# Altium footprint library cool_library.PcbLib: 1182 footprints (part 67 of 75)
Each footprint in its own frame and in the unit in brackets; x right, y up, seen from the top. Pads: shape width x height; smd on the part's side, far side on the other; paste and mask are expansions set on the pad; w line width, h text height; cw(c..) or ccw(c..) is an arc to the next point about the centre after c.
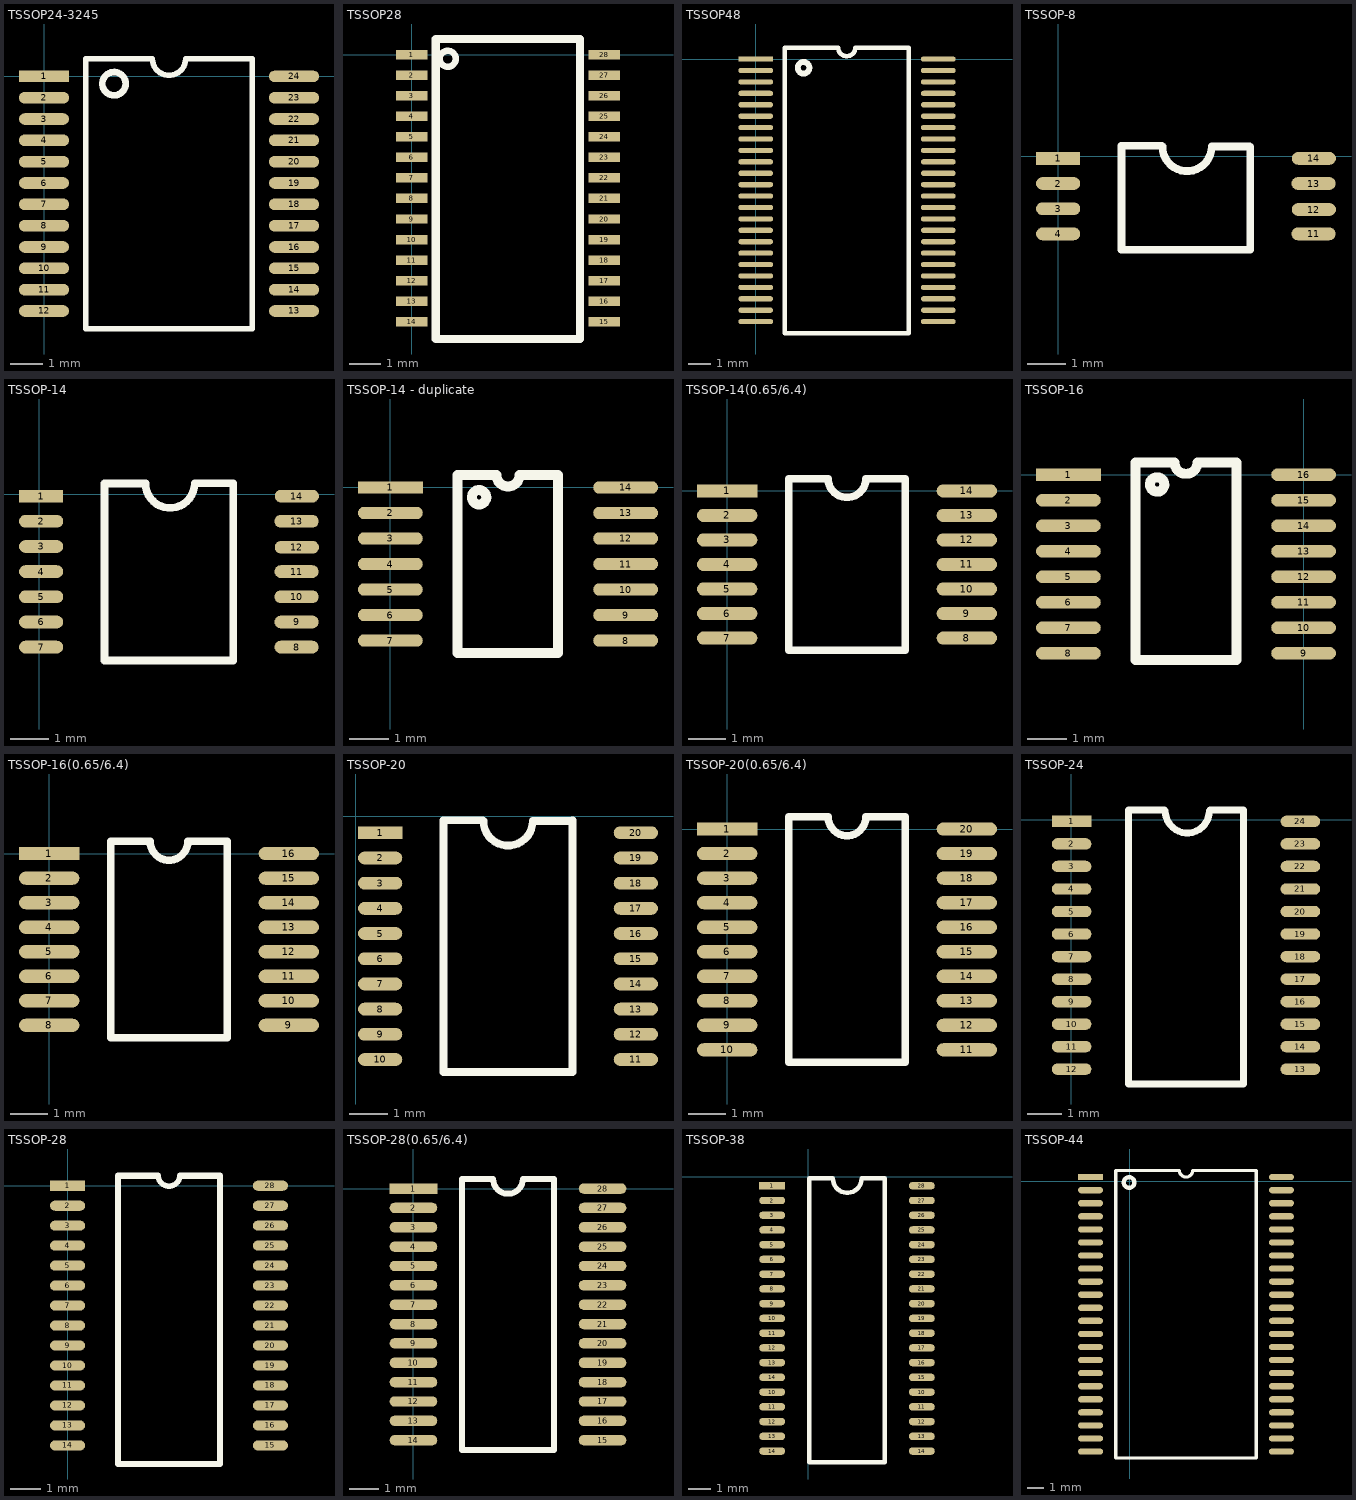
[diagram p66: the footprints below, top view; thin cyan lines are the x and y axes]

## TSSOP24-3245 [mil]
pads (24):
  rect 60x14 smd: 1(0,0)
  oval 60x14 smd: 2(0,-25.59) 3(0,-51.18) 4(0,-76.77) 5(0,-102.36) 6(0,-127.95) 7(0,-153.54) 8(0,-179.13) 9(0,-204.72) 10(0,-230.32) 11(0,-255.91) 12(0,-281.5) 13(300,-281.5) 14(300,-255.91) 15(300,-230.32) 16(300,-204.72) 17(300,-179.13) 18(300,-153.54) 19(300,-127.95) 20(300,-102.36) 21(300,-76.77) 22(300,-51.18) 23(300,-25.59) 24(300,0)
Top Overlay:
  circle w8: c84,-8.75 r14
  lines w6.69: 50,21.25 130,21.25 ccw(c150,21.25) 170,21.25 250,21.25
  lines w7: 50,21.25 50,-302.75 250,-302.75 250,21.25

## TSSOP28 [mm]
pads (28):
  rect 1x0.3 smd: 1(0,0) 2(0,-0.65) 3(0,-1.3) 4(0,-1.95) 5(0,-2.6) 6(0,-3.25) 7(0,-3.9) 8(0,-4.55) 9(0,-5.2) 10(0,-5.85) 11(0,-6.5) 12(0,-7.15) 13(0,-7.8) 14(0,-8.45) 15(6.1,-8.45) 16(6.1,-7.8) 17(6.1,-7.15) 18(6.1,-6.5) 19(6.1,-5.85) 20(6.1,-5.2) 21(6.1,-4.55) 22(6.1,-3.9) 23(6.1,-3.25) 24(6.1,-2.6) 25(6.1,-1.95) 26(6.1,-1.3) 27(6.1,-0.65) 28(6.1,0)
Top Overlay:
  circle w0.203: c1.143,-0.127 r0.254
  lines w0.254: 0.762,-9 5.334,-9 5.334,0.5 0.762,0.5 0.762,-9

## TSSOP48 [mil]
pads (48):
  rect 60x9 smd: 1(0,0)
  oval 60x9 smd: 2(0,-19.68) 3(0,-39.37) 4(0,-59.05) 5(0,-78.74) 6(0,-98.42) 7(0,-118.11) 8(0,-137.79) 9(0,-157.48) 10(0,-177.16) 11(0,-196.85) 12(0,-216.53) 13(0,-236.22) 14(0,-255.91) 15(0,-275.59) 16(0,-295.27) 17(0,-314.96) 18(0,-334.64) 19(0,-354.33) 20(0,-374.01) 21(0,-393.7) 22(0,-413.38) 23(0,-433.07) 24(0,-452.75) 25(315,-452.75) 26(315,-433.07) 27(315,-413.38) 28(315,-393.7) 29(315,-374.01) 30(315,-354.33) 31(315,-334.64) 32(315,-314.96) 33(315,-295.27) 34(315,-275.59) 35(315,-255.91) 36(315,-236.22) 37(315,-216.53) 38(315,-196.85) 39(315,-177.16) 40(315,-157.48) 41(315,-137.79) 42(315,-118.11) 43(315,-98.42) 44(315,-78.74) 45(315,-59.05) 46(315,-39.37) 47(315,-19.68) 48(315,0)
Top Overlay:
  circle w10: c82.6,-15 r10
  lines w7.87: 50,-472.6 264.09,-472.6 264.09,19.84 171.9,19.84 cw(c157.05,19.84) 142.19,19.84 50,19.84 50,-472.6

## TSSOP-8 [mil]
pads (8):
  rect 45x12.99 smd: 1(-0.16,-2)
  oval 45x12.99 smd: 2(-0.16,-27.59) 3(-0.16,-53.18) 4(-0.16,-78.77) 11(259.69,-78.77) 12(260,-54) 13(259.69,-27.59) 14(260,-2)
Top Overlay:
  lines w7.87: 105.2,10.79 64.21,10.79 64.21,-94.88 195.31,-94.88 195.31,9.84 ; 106,10 ccw(c131,10) 156,10 194.52,10

## TSSOP-14 [mil]
pads (14):
  rect 45x12.99 smd: 1(1.84,-2)
  oval 45x12.99 smd: 2(1.84,-27.59) 3(1.84,-53.18) 4(1.84,-78.77) 5(1.84,-104.36) 6(1.84,-129.95) 7(1.84,-155.54) 8(261.69,-155.54) 9(261.69,-129.95) 10(261.69,-104.36) 11(261.69,-78.77) 12(262,-54) 13(261.69,-27.59) 14(262,-2)
Top Overlay:
  lines w7.87: 107.64,10.79 66.21,10.79 66.21,-169.29 197.31,-169.29 197.31,10.79 ; 108,11 ccw(c133,11) 158,11 197.11,11

## TSSOP-14 - duplicate [mil]
pads (14):
  rect 65x12.5 smd: 1(0,0)
  oval 65x12.5 smd: 2(0,-25.59) 3(0,-51.18) 4(0,-76.77) 5(0,-102.36) 6(0,-127.95) 7(0,-153.54) 8(236,-153.54) 9(236,-127.95) 10(236,-102.36) 11(236,-76.77) 12(236,-51.18) 13(236,-25.59) 14(236,0)
Top Overlay:
  lines w10: 89,-17 cw(c89,-9.79) 90.02,-16.93 ; 67.5,-166 67.5,12.5 106.46,12.5 ccw(c118,12.5) 129.54,12.5 168,12.5 168,-166 67.5,-166

## TSSOP-14(0.65/6.4) [mm]
pads (14):
  rect 1.6x0.35 smd: 1(0,0)
  oval 1.6x0.35 smd: 2(0,-0.65) 3(0,-1.3) 4(0,-1.95) 5(0,-2.6) 6(0,-3.25) 7(0,-3.9) 8(6.35,-3.9) 9(6.35,-3.25) 10(6.35,-2.6) 11(6.35,-1.95) 12(6.35,-1.3) 13(6.35,-0.65) 14(6.35,0)
Top Overlay:
  lines w0.2: 1.635,-4.225 4.715,-4.225 4.715,0.325 3.675,0.325 cw(c3.175,0.325) 2.675,0.325 1.635,0.325 1.635,-4.225

## TSSOP-16 [mil]
pads (16):
  rect 65x12.5 smd: 1(-236,0)
  oval 65x12.5 smd: 2(-236,-25.59) 3(-236,-51.18) 4(-236,-76.77) 5(-236,-102.36) 6(-236,-127.95) 7(-236,-153.54) 8(-236,-179.13) 9(0,-179.13) 10(0,-153.54) 11(0,-127.95) 12(0,-102.36) 13(0,-76.77) 14(0,-51.18) 15(0,-25.59) 16(0,0)
Top Overlay:
  lines w10: -147,-17 cw(c-147,-9.79) -145.98,-16.93 ; -168.5,-186 -67.5,-186 -67.5,12.5 -106.46,12.5 cw(c-118,12.5) -129.54,12.5 -168.5,12.5 -168.5,-186

## TSSOP-16(0.65/6.4) [mm]
pads (16):
  rect 1.6x0.35 smd: 1(0,0)
  oval 1.6x0.35 smd: 2(0,-0.65) 3(0,-1.3) 4(0,-1.95) 5(0,-2.6) 6(0,-3.25) 7(0,-3.9) 8(0,-4.55) 9(6.35,-4.55) 10(6.35,-3.9) 11(6.35,-3.25) 12(6.35,-2.6) 13(6.35,-1.95) 14(6.35,-1.3) 15(6.35,-0.65) 16(6.35,0)
Top Overlay:
  lines w0.2: 1.635,-4.875 1.635,0.325 2.675,0.325 ccw(c3.175,0.325) 3.675,0.325 4.715,0.325 4.715,-4.875 1.635,-4.875

## TSSOP-20 [mm]
pads (20):
  rect 1.143x0.33 smd: 1(0.635,-0.432)
  oval 1.143x0.33 smd: 2(0.635,-1.082) 3(0.635,-1.732) 4(0.635,-2.382) 5(0.635,-3.032) 6(0.635,-3.682) 7(0.635,-4.332) 8(0.635,-4.982) 9(0.635,-5.632) 10(0.635,-6.282) 11(7.235,-6.282) 12(7.235,-5.632) 13(7.235,-4.982) 14(7.235,-4.332) 15(7.235,-3.682) 16(7.235,-3.032) 17(7.235,-2.382) 18(7.235,-1.732) 19(7.235,-1.082) 20(7.235,-0.432)
Top Overlay:
  lines w0.2: 3.282,-0.107 2.27,-0.107 2.27,-6.607 5.6,-6.607 5.6,-0.107 ; 3.302,-0.127 ccw(c3.937,-0.127) 4.572,-0.127 5.58,-0.127

## TSSOP-20(0.65/6.4) [mm]
pads (20):
  rect 1.6x0.35 smd: 1(0,0)
  oval 1.6x0.35 smd: 2(0,-0.65) 3(0,-1.3) 4(0,-1.95) 5(0,-2.6) 6(0,-3.25) 7(0,-3.9) 8(0,-4.55) 9(0,-5.2) 10(0,-5.85) 11(6.35,-5.85) 12(6.35,-5.2) 13(6.35,-4.55) 14(6.35,-3.9) 15(6.35,-3.25) 16(6.35,-2.6) 17(6.35,-1.95) 18(6.35,-1.3) 19(6.35,-0.65) 20(6.35,0)
Top Overlay:
  lines w0.2: 1.635,-6.175 1.635,0.325 2.675,0.325 ccw(c3.175,0.325) 3.675,0.325 4.715,0.325 4.715,-6.175 1.635,-6.175

## TSSOP-24 [mm]
pads (24):
  rect 1.143x0.33 smd: 1(0.016,-0.046)
  oval 1.143x0.33 smd: 2(0.016,-0.696) 3(0.016,-1.346) 4(0.016,-1.996) 5(0.016,-2.646) 6(0.016,-3.296) 7(0.016,-3.946) 8(0.016,-4.596) 9(0.016,-5.246) 10(0.016,-5.896) 11(0.016,-6.546) 12(0.016,-7.196) 13(6.616,-7.196) 14(6.616,-6.546) 15(6.616,-5.896) 16(6.616,-5.246) 17(6.616,-4.596) 18(6.616,-3.946) 19(6.616,-3.296) 20(6.616,-2.646) 21(6.616,-1.996) 22(6.616,-1.346) 23(6.616,-0.696) 24(6.616,-0.046)
Top Overlay:
  lines w0.2: 2.692,0.279 1.651,0.279 1.651,-7.62 4.981,-7.62 4.981,0.279 4.013,0.279 ; 2.718,0.254 ccw(c3.353,0.254) 3.988,0.254

## TSSOP-28 [mm]
pads (28):
  rect 1.143x0.33 smd: 1(0,0)
  oval 1.143x0.33 smd: 2(0,-0.65) 3(0,-1.3) 4(0,-1.95) 5(0,-2.6) 6(0,-3.25) 7(0,-3.9) 8(0,-4.55) 9(0,-5.2) 10(0,-5.85) 11(0,-6.5) 12(0,-7.15) 13(0,-7.8) 14(0,-8.45) 15(6.6,-8.45) 16(6.6,-7.8) 17(6.6,-7.15) 18(6.6,-6.5) 19(6.6,-5.85) 20(6.6,-5.2) 21(6.6,-4.55) 22(6.6,-3.9) 23(6.6,-3.25) 24(6.6,-2.6) 25(6.6,-1.95) 26(6.6,-1.3) 27(6.6,-0.65) 28(6.6,0)
Top Overlay:
  lines w0.178: 2.941,0.347 ccw(c3.3,0.347) 3.659,0.347
  lines w0.2: 2.941,0.325 1.635,0.325 1.635,-9.054 4.965,-9.054 4.965,0.325 3.659,0.325

## TSSOP-28(0.65/6.4) [mm]
pads (28):
  rect 1.6x0.35 smd: 1(0,0)
  oval 1.6x0.35 smd: 2(0,-0.65) 3(0,-1.3) 4(0,-1.95) 5(0,-2.6) 6(0,-3.25) 7(0,-3.9) 8(0,-4.55) 9(0,-5.2) 10(0,-5.85) 11(0,-6.5) 12(0,-7.15) 13(0,-7.8) 14(0,-8.45) 15(6.35,-8.45) 16(6.35,-7.8) 17(6.35,-7.15) 18(6.35,-6.5) 19(6.35,-5.85) 20(6.35,-5.2) 21(6.35,-4.55) 22(6.35,-3.9) 23(6.35,-3.25) 24(6.35,-2.6) 25(6.35,-1.95) 26(6.35,-1.3) 27(6.35,-0.65) 28(6.35,0)
Top Overlay:
  lines w0.2: 1.635,-8.775 1.635,0.325 2.675,0.325 ccw(c3.175,0.325) 3.675,0.325 4.715,0.325 4.715,-8.775 1.635,-8.775

## TSSOP-38 [mm]
pads (38):
  rect 1.143x0.33 smd: 1(-1.584,-0.401)
  oval 1.143x0.33 smd: 2(-1.584,-1.051) 3(-1.584,-1.701) 4(-1.584,-2.351) 5(-1.584,-3.001) 6(-1.584,-3.651) 7(-1.584,-4.301) 8(-1.584,-4.951) 9(-1.584,-5.601) 10(-1.584,-9.501) 10(-1.584,-6.251) 10(5.016,-9.501) 11(-1.584,-10.151) 11(-1.584,-6.901) 11(5.016,-10.151) 12(-1.584,-10.801) 12(-1.584,-7.551) 12(5.016,-10.801) 13(-1.584,-11.451) 13(-1.584,-8.201) 13(5.016,-11.451) 14(-1.584,-12.101) 14(-1.584,-8.851) 14(5.016,-12.101) 15(5.016,-8.851) 16(5.016,-8.201) 17(5.016,-7.551) 18(5.016,-6.901) 19(5.016,-6.251) 20(5.016,-5.601) 21(5.016,-4.951) 22(5.016,-4.301) 23(5.016,-3.651) 24(5.016,-3.001) 25(5.016,-2.351) 26(5.016,-1.701) 27(5.016,-1.051) 28(5.016,-0.401)
Top Overlay:
  lines w0.2: 0.051,-12.6 3.381,-12.6 3.381,-0.076 2.362,-0.076 cw(c1.727,-0.076) 1.092,-0.076 0.051,-0.076 0.051,-12.6

## TSSOP-44 [mil]
pads (44):
  rect 60x15 smd: 1(-94,10)
  oval 60x15 smd: 2(-94,-21.5) 3(-94,-52.99) 4(-94,-84.49) 5(-94,-115.98) 6(-94,-147.48) 7(-94,-178.98) 8(-94,-210.47) 9(-94,-241.97) 10(-94,-273.46) 11(-94,-304.96) 12(-94,-336.46) 13(-94,-367.95) 14(-94,-399.45) 15(-94,-430.95) 16(-94,-462.44) 17(-94,-493.94) 18(-94,-525.43) 19(-94,-556.93) 20(-94,-588.43) 21(-94,-619.92) 22(-94,-651.42) 23(365.99,-651.42) 24(365.99,-619.92) 25(365.99,-588.43) 26(365.99,-556.93) 27(365.99,-525.43) 28(365.99,-493.94) 29(365.99,-462.44) 30(365.99,-430.95) 31(365.99,-399.45) 32(365.99,-367.95) 33(365.99,-336.46) 34(365.99,-304.96) 35(365.99,-273.46) 36(365.99,-241.97) 37(365.99,-210.47) 38(365.99,-178.98) 39(365.99,-147.48) 40(365.99,-115.98) 41(365.99,-84.49) 42(365.99,-52.99) 43(365.99,-21.5) 44(365.99,10)
Top Overlay:
  circle w10: c-1.21,-3 r12.81
  lines w7.87: -33,-667.17 -33,25.75 120.27,25.75 ccw(c136.09,25.75) 151.91,25.75 305.19,25.75 305.19,-667.17 -33,-667.17